# Altium schematic symbol library Regulator_Switching.SchLib: 1120 symbols (part 2 of 8)
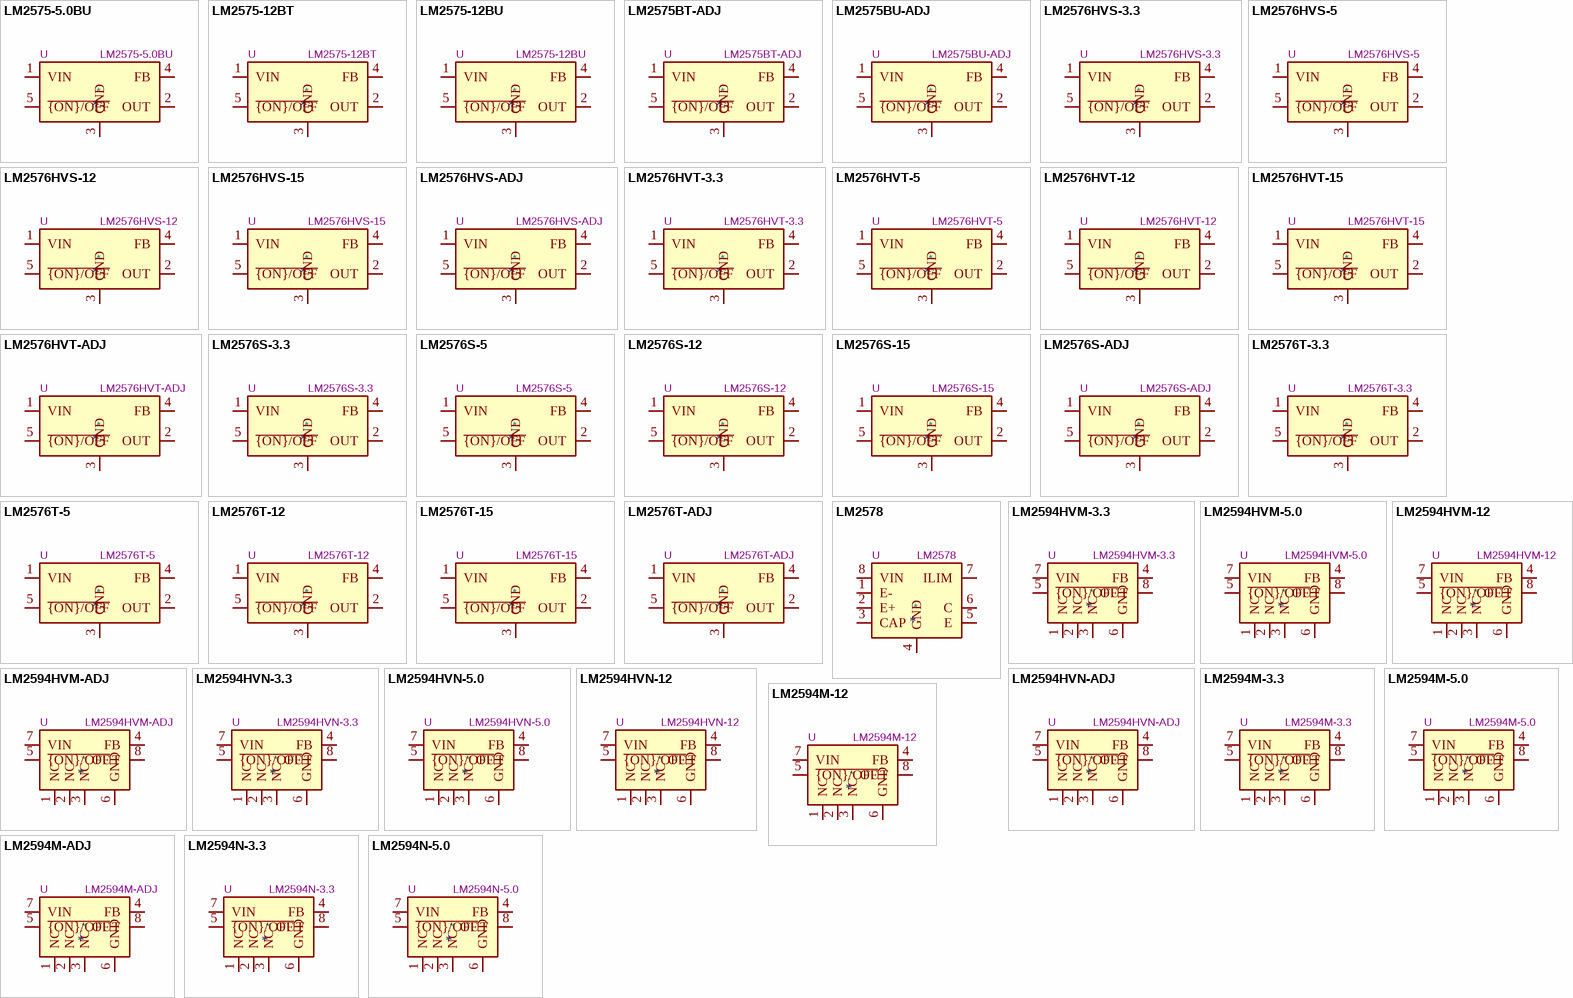
[diagram p28: symbols LM2575-5.0BU to LM2594N-5.0]

## LM2576HVT-12
designator *  value LM2576HVT-12  Reference: U
ki_keywords: Step-Down Voltage Regulator 12V 3A High Voltage; ki_description: 12V, 3A SIMPLE SWITCHER® Step-Down Voltage Regulator, High Voltage Input, TO-220-5; ki_fp_filters: TO?220*; Footprint: Package_TO_SOT_THT:TO-220-5_Vertical; Datasheet: http://www.ti.com/lit/ds/symlink/lm2576.pdf
pins: 1 VIN, 2 OUT, 3 GND, 4 FB, 5 ~{{ON}/OFF}

## LM2576HVT-15
designator *  value LM2576HVT-15  Reference: U
ki_keywords: Step-Down Voltage Regulator 15V 3A High Voltage; ki_description: 15V, 3A SIMPLE SWITCHER® Step-Down Voltage Regulator, High Voltage Input, TO-220-5; ki_fp_filters: TO?220*; Footprint: Package_TO_SOT_THT:TO-220-5_Vertical; Datasheet: http://www.ti.com/lit/ds/symlink/lm2576.pdf
pins: 1 VIN, 2 OUT, 3 GND, 4 FB, 5 ~{{ON}/OFF}

## LM2576HVT-ADJ
designator *  value LM2576HVT-ADJ  Reference: U
ki_keywords: Step-Down Voltage Regulator 3A Adjustable High Voltage; ki_description: Adjustable Output Voltage, 3A SIMPLE SWITCHER® Step-Down Voltage Regulator, High Voltage Input, TO-220-5; ki_fp_filters: TO?220*; Footprint: Package_TO_SOT_THT:TO-220-5_Vertical; Datasheet: http://www.ti.com/lit/ds/symlink/lm2576.pdf
pins: 1 VIN, 2 OUT, 3 GND, 4 FB, 5 ~{{ON}/OFF}

## LM2576S-3.3
designator *  value LM2576S-3.3  Reference: U
ki_keywords: Step-Down Voltage Regulator 3.3V 3A; ki_description: 3.3V, 3A SIMPLE SWITCHER® Step-Down Voltage Regulator, TO-263; ki_fp_filters: TO?263*; Footprint: Package_TO_SOT_SMD:TO-263-5_TabPin3; Datasheet: http://www.ti.com/lit/ds/symlink/lm2576.pdf
pins: 1 VIN, 2 OUT, 3 GND, 4 FB, 5 ~{{ON}/OFF}

## LM2576S-5
designator *  value LM2576S-5  Reference: U
ki_keywords: Step-Down Voltage Regulator 5V 3A; ki_description: 5V, 3A SIMPLE SWITCHER® Step-Down Voltage Regulator, TO-263; ki_fp_filters: TO?263*; Footprint: Package_TO_SOT_SMD:TO-263-5_TabPin3; Datasheet: http://www.ti.com/lit/ds/symlink/lm2576.pdf
pins: 1 VIN, 2 OUT, 3 GND, 4 FB, 5 ~{{ON}/OFF}

## LM2576S-12
designator *  value LM2576S-12  Reference: U
ki_keywords: Step-Down Voltage Regulator 12V 3A; ki_description: 12V, 3A SIMPLE SWITCHER® Step-Down Voltage Regulator, TO-263; ki_fp_filters: TO?263*; Footprint: Package_TO_SOT_SMD:TO-263-5_TabPin3; Datasheet: http://www.ti.com/lit/ds/symlink/lm2576.pdf
pins: 1 VIN, 2 OUT, 3 GND, 4 FB, 5 ~{{ON}/OFF}

## LM2576S-15
designator *  value LM2576S-15  Reference: U
ki_keywords: Step-Down Voltage Regulator 15V 3A; ki_description: 15V, 3A SIMPLE SWITCHER® Step-Down Voltage Regulator, TO-263; ki_fp_filters: TO?263*; Footprint: Package_TO_SOT_SMD:TO-263-5_TabPin3; Datasheet: http://www.ti.com/lit/ds/symlink/lm2576.pdf
pins: 1 VIN, 2 OUT, 3 GND, 4 FB, 5 ~{{ON}/OFF}

## LM2576S-ADJ
designator *  value LM2576S-ADJ  Reference: U
ki_keywords: Step-Down Voltage Regulator 3A Adjustable; ki_description: Adjustable Output Voltage, 3A SIMPLE SWITCHER® Step-Down Voltage Regulator, TO-263; ki_fp_filters: TO?263*; Footprint: Package_TO_SOT_SMD:TO-263-5_TabPin3; Datasheet: http://www.ti.com/lit/ds/symlink/lm2576.pdf
pins: 1 VIN, 2 OUT, 3 GND, 4 FB, 5 ~{{ON}/OFF}

## LM2576T-3.3
designator *  value LM2576T-3.3  Reference: U
ki_keywords: Step-Down Voltage Regulator 3.3V 3A; ki_description: 3.3V, 3A SIMPLE SWITCHER® Step-Down Voltage Regulator, TO-220-5; ki_fp_filters: TO?220*; Footprint: Package_TO_SOT_THT:TO-220-5_Vertical; Datasheet: http://www.ti.com/lit/ds/symlink/lm2576.pdf
pins: 1 VIN, 2 OUT, 3 GND, 4 FB, 5 ~{{ON}/OFF}

## LM2576T-5
designator *  value LM2576T-5  Reference: U
ki_keywords: Step-Down Voltage Regulator 5V 3A; ki_description: 5V, 3A SIMPLE SWITCHER® Step-Down Voltage Regulator, TO-220-5; ki_fp_filters: TO?220*; Footprint: Package_TO_SOT_THT:TO-220-5_Vertical; Datasheet: http://www.ti.com/lit/ds/symlink/lm2576.pdf
pins: 1 VIN, 2 OUT, 3 GND, 4 FB, 5 ~{{ON}/OFF}

## LM2576T-12
designator *  value LM2576T-12  Reference: U
ki_keywords: Step-Down Voltage Regulator 12V 3A; ki_description: 12V, 3A SIMPLE SWITCHER® Step-Down Voltage Regulator, TO-220-5; ki_fp_filters: TO?220*; Footprint: Package_TO_SOT_THT:TO-220-5_Vertical; Datasheet: http://www.ti.com/lit/ds/symlink/lm2576.pdf
pins: 1 VIN, 2 OUT, 3 GND, 4 FB, 5 ~{{ON}/OFF}

## LM2576T-15
designator *  value LM2576T-15  Reference: U
ki_keywords: Step-Down Voltage Regulator 15V 3A; ki_description: 15V, 3A SIMPLE SWITCHER® Step-Down Voltage Regulator, TO-220-5; ki_fp_filters: TO?220*; Footprint: Package_TO_SOT_THT:TO-220-5_Vertical; Datasheet: http://www.ti.com/lit/ds/symlink/lm2576.pdf
pins: 1 VIN, 2 OUT, 3 GND, 4 FB, 5 ~{{ON}/OFF}

## LM2576T-ADJ
designator *  value LM2576T-ADJ  Reference: U
ki_keywords: Step-Down Voltage Regulator 3A Adjustable; ki_description: Adjustable Output Voltage, 3A SIMPLE SWITCHER® Step-Down Voltage Regulator, TO-220-5; ki_fp_filters: TO?220*; Footprint: Package_TO_SOT_THT:TO-220-5_Vertical; Datasheet: http://www.ti.com/lit/ds/symlink/lm2576.pdf
pins: 1 VIN, 2 OUT, 3 GND, 4 FB, 5 ~{{ON}/OFF}

## LM2578
designator *  value LM2578  Reference: U
ki_keywords: switching regulator; ki_description: 750mA, Switching Regulator, adjustable output voltage, DIP-8/SOIC-8; ki_fp_filters: DIP*W7.62mm* SOIC*3.9x4.9mm*; Datasheet: http://www.ti.com/lit/ds/symlink/lm3578a.pdf
pins: 1 E-, 2 E+, 3 CAP, 4 GND, 5 E, 6 C, 7 ILIM, 8 VIN

## LM2594HVM-3.3
designator *  value LM2594HVM-3.3  Reference: U
ki_keywords: buck converter regulator step-down voltage simple switcher fixed; ki_description: 3.3V, 0.5A SIMPLE SWITCHER® Step-Down Voltage Regulator, Maximum VIN 60V, SOIC-8; ki_fp_filters: SOIC*3.9x4.9mm*; Footprint: Package_SO:SOIC-8_3.9x4.9mm_P1.27mm; Datasheet: http://www.ti.com/lit/ds/symlink/lm2594.pdf
pins: 1 NC, 2 NC, 3 NC, 4 FB, 5 ~{{ON}/OFF}, 6 GND, 7 VIN, 8 OUT

## LM2594HVM-5.0
designator *  value LM2594HVM-5.0  Reference: U
ki_keywords: buck converter regulator step-down voltage simple switcher fixed; ki_description: 5.0V, 0.5A SIMPLE SWITCHER® Step-Down Voltage Regulator, Maximum VIN 60V, SOIC-8; ki_fp_filters: SOIC*3.9x4.9mm*; Footprint: Package_SO:SOIC-8_3.9x4.9mm_P1.27mm; Datasheet: http://www.ti.com/lit/ds/symlink/lm2594.pdf
pins: 1 NC, 2 NC, 3 NC, 4 FB, 5 ~{{ON}/OFF}, 6 GND, 7 VIN, 8 OUT

## LM2594HVM-12
designator *  value LM2594HVM-12  Reference: U
ki_keywords: buck converter regulator step-down voltage simple switcher fixed; ki_description: 12V, 0.5A SIMPLE SWITCHER® Step-Down Voltage Regulator, Maximum VIN 60V, SOIC-8; ki_fp_filters: SOIC*3.9x4.9mm*; Footprint: Package_SO:SOIC-8_3.9x4.9mm_P1.27mm; Datasheet: http://www.ti.com/lit/ds/symlink/lm2594.pdf
pins: 1 NC, 2 NC, 3 NC, 4 FB, 5 ~{{ON}/OFF}, 6 GND, 7 VIN, 8 OUT

## LM2594HVM-ADJ
designator *  value LM2594HVM-ADJ  Reference: U
ki_keywords: buck converter regulator step-down voltage simple switcher adjustable; ki_description: Adjustable Output Voltage, 0.5A SIMPLE SWITCHER® Step-Down Voltage Regulator, Maximum VIN 60V, SOIC-8; ki_fp_filters: SOIC*3.9x4.9mm*; Footprint: Package_SO:SOIC-8_3.9x4.9mm_P1.27mm; Datasheet: http://www.ti.com/lit/ds/symlink/lm2594.pdf
pins: 1 NC, 2 NC, 3 NC, 4 FB, 5 ~{{ON}/OFF}, 6 GND, 7 VIN, 8 OUT

## LM2594HVN-3.3
designator *  value LM2594HVN-3.3  Reference: U
ki_keywords: buck converter regulator step-down voltage simple switcher fixed; ki_description: 3.3V, 0.5A SIMPLE SWITCHER® Step-Down Voltage Regulator, Maximum VIN 60V, DIP-8; ki_fp_filters: DIP*W7.62mm*; Footprint: Package_DIP:DIP-8_W7.62mm; Datasheet: http://www.ti.com/lit/ds/symlink/lm2594.pdf
pins: 1 NC, 2 NC, 3 NC, 4 FB, 5 ~{{ON}/OFF}, 6 GND, 7 VIN, 8 OUT

## LM2594HVN-5.0
designator *  value LM2594HVN-5.0  Reference: U
ki_keywords: buck converter regulator step-down voltage simple switcher fixed; ki_description: 5.0V, 0.5A SIMPLE SWITCHER® Step-Down Voltage Regulator, Maximum VIN 60V, DIP-8; ki_fp_filters: DIP*W7.62mm*; Footprint: Package_DIP:DIP-8_W7.62mm; Datasheet: http://www.ti.com/lit/ds/symlink/lm2594.pdf
pins: 1 NC, 2 NC, 3 NC, 4 FB, 5 ~{{ON}/OFF}, 6 GND, 7 VIN, 8 OUT

## LM2594HVN-12
designator *  value LM2594HVN-12  Reference: U
ki_keywords: buck converter regulator step-down voltage simple switcher fixed; ki_description: 12V, 0.5A SIMPLE SWITCHER® Step-Down Voltage Regulator, Maximum VIN 60V, DIP-8; ki_fp_filters: DIP*W7.62mm*; Footprint: Package_DIP:DIP-8_W7.62mm; Datasheet: http://www.ti.com/lit/ds/symlink/lm2594.pdf
pins: 1 NC, 2 NC, 3 NC, 4 FB, 5 ~{{ON}/OFF}, 6 GND, 7 VIN, 8 OUT

## LM2594HVN-ADJ
designator *  value LM2594HVN-ADJ  Reference: U
ki_keywords: buck converter regulator step-down voltage simple switcher adjustable; ki_description: Adjustable Output Voltage, 0.5A SIMPLE SWITCHER® Step-Down Voltage Regulator, Maximum VIN 60V, DIP-8; ki_fp_filters: DIP*W7.62mm*; Footprint: Package_DIP:DIP-8_W7.62mm; Datasheet: http://www.ti.com/lit/ds/symlink/lm2594.pdf
pins: 1 NC, 2 NC, 3 NC, 4 FB, 5 ~{{ON}/OFF}, 6 GND, 7 VIN, 8 OUT

## LM2594M-3.3
designator *  value LM2594M-3.3  Reference: U
ki_keywords: buck converter regulator step-down voltage simple switcher fixed; ki_description: 3.3V, 0.5A SIMPLE SWITCHER® Step-Down Voltage Regulator, Maximum VIN 45V, SOIC-8; ki_fp_filters: SOIC*3.9x4.9mm*; Footprint: Package_SO:SOIC-8_3.9x4.9mm_P1.27mm; Datasheet: http://www.ti.com/lit/ds/symlink/lm2594.pdf
pins: 1 NC, 2 NC, 3 NC, 4 FB, 5 ~{{ON}/OFF}, 6 GND, 7 VIN, 8 OUT

## LM2594M-5.0
designator *  value LM2594M-5.0  Reference: U
ki_keywords: buck converter regulator step-down voltage simple switcher fixed; ki_description: 5.0V, 0.5A SIMPLE SWITCHER® Step-Down Voltage Regulator, Maximum VIN 45V, SOIC-8; ki_fp_filters: SOIC*3.9x4.9mm*; Footprint: Package_SO:SOIC-8_3.9x4.9mm_P1.27mm; Datasheet: http://www.ti.com/lit/ds/symlink/lm2594.pdf
pins: 1 NC, 2 NC, 3 NC, 4 FB, 5 ~{{ON}/OFF}, 6 GND, 7 VIN, 8 OUT

## LM2594M-12
designator *  value LM2594M-12  Reference: U
ki_keywords: buck converter regulator step-down voltage simple switcher fixed; ki_description: 12V, 0.5A SIMPLE SWITCHER® Step-Down Voltage Regulator, Maximum VIN 45V, SOIC-8; ki_fp_filters: SOIC*3.9x4.9mm*; Footprint: Package_SO:SOIC-8_3.9x4.9mm_P1.27mm; Datasheet: http://www.ti.com/lit/ds/symlink/lm2594.pdf
pins: 1 NC, 2 NC, 3 NC, 4 FB, 5 ~{{ON}/OFF}, 6 GND, 7 VIN, 8 OUT

## LM2594M-ADJ
designator *  value LM2594M-ADJ  Reference: U
ki_keywords: buck converter regulator step-down voltage simple switcher adjustable; ki_description: Adjustable Output Voltage, 0.5A SIMPLE SWITCHER® Step-Down Voltage Regulator, Maximum VIN 45V, SOIC-8; ki_fp_filters: SOIC*3.9x4.9mm*; Footprint: Package_SO:SOIC-8_3.9x4.9mm_P1.27mm; Datasheet: http://www.ti.com/lit/ds/symlink/lm2594.pdf
pins: 1 NC, 2 NC, 3 NC, 4 FB, 5 ~{{ON}/OFF}, 6 GND, 7 VIN, 8 OUT

## LM2594N-3.3
designator *  value LM2594N-3.3  Reference: U
ki_keywords: buck converter regulator step-down voltage simple switcher fixed; ki_description: 3.3V, 0.5A SIMPLE SWITCHER® Step-Down Voltage Regulator, Maximum VIN 45V, DIP-8; ki_fp_filters: DIP*W7.62mm*; Footprint: Package_DIP:DIP-8_W7.62mm; Datasheet: http://www.ti.com/lit/ds/symlink/lm2594.pdf
pins: 1 NC, 2 NC, 3 NC, 4 FB, 5 ~{{ON}/OFF}, 6 GND, 7 VIN, 8 OUT

## LM2594N-5.0
designator *  value LM2594N-5.0  Reference: U
ki_keywords: buck converter regulator step-down voltage simple switcher fixed; ki_description: 5.0V, 0.5A SIMPLE SWITCHER® Step-Down Voltage Regulator, Maximum VIN 45V, DIP-8; ki_fp_filters: DIP*W7.62mm*; Footprint: Package_DIP:DIP-8_W7.62mm; Datasheet: http://www.ti.com/lit/ds/symlink/lm2594.pdf
pins: 1 NC, 2 NC, 3 NC, 4 FB, 5 ~{{ON}/OFF}, 6 GND, 7 VIN, 8 OUT

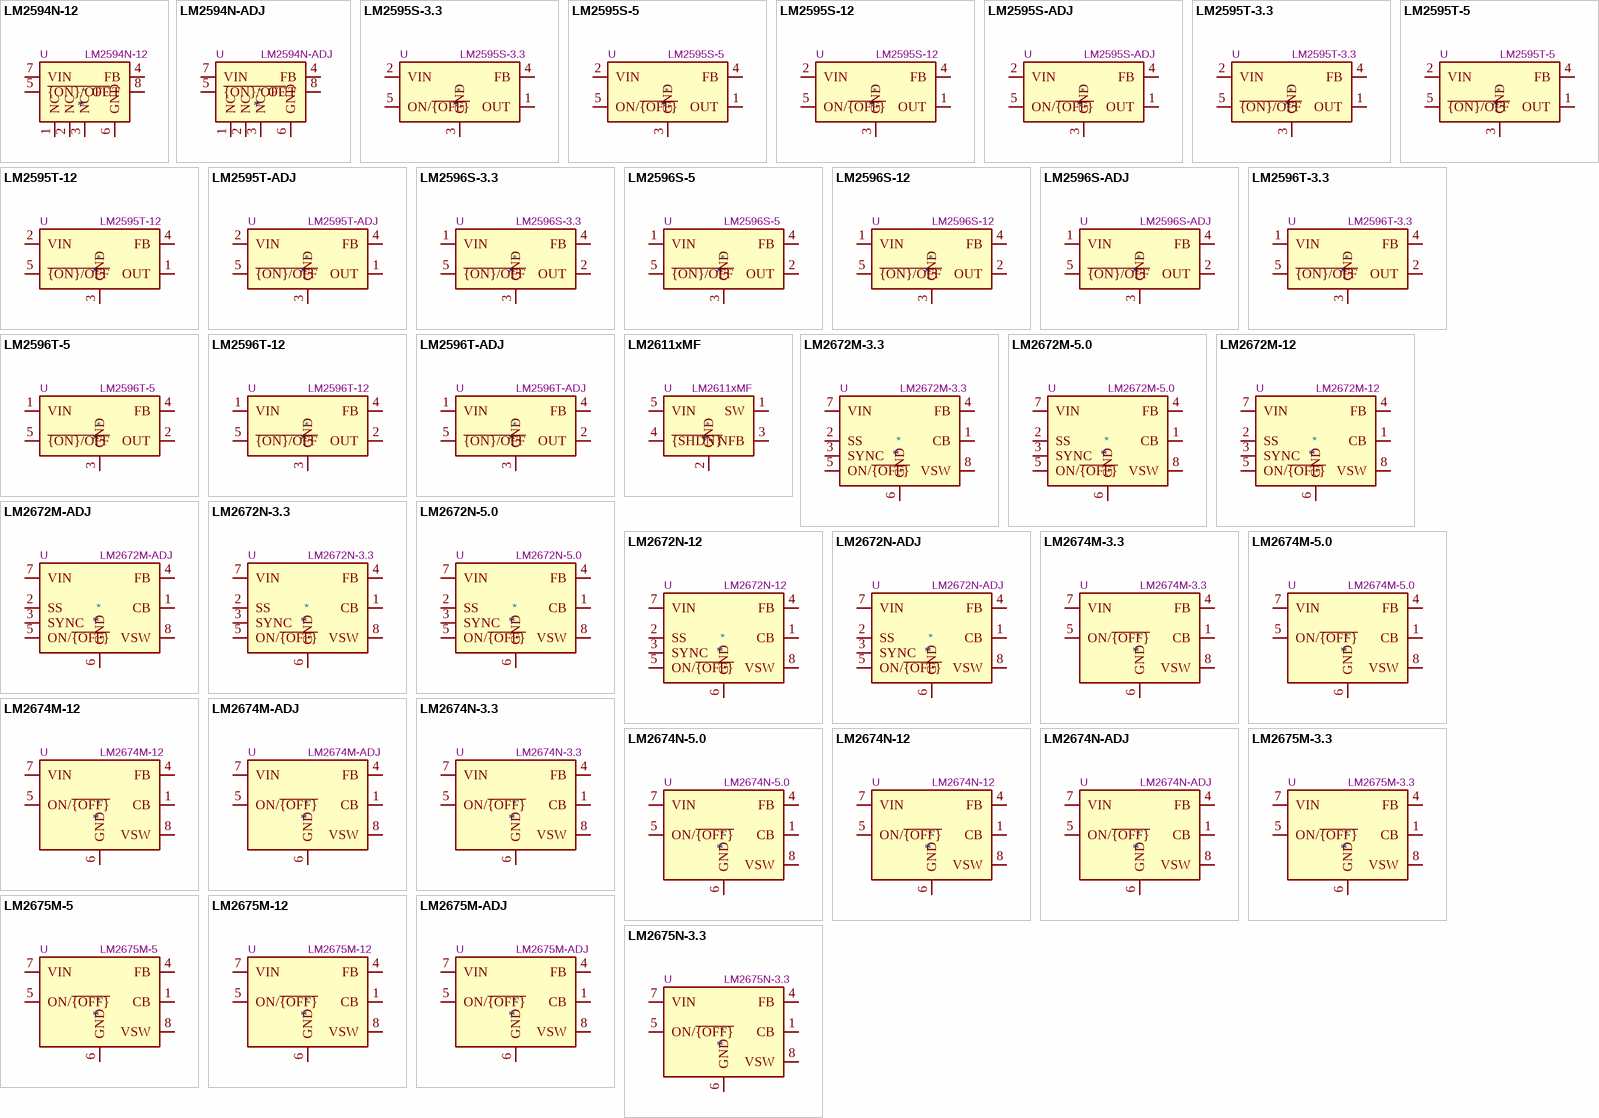
[diagram p5: symbols LM2594N-12 to LM2675N-3.3]

## LM2594N-12
designator *  value LM2594N-12  Reference: U
ki_keywords: buck converter regulator step-down voltage simple switcher fixed; ki_description: 12V, 0.5A SIMPLE SWITCHER® Step-Down Voltage Regulator, Maximum VIN 45V, DIP-8; ki_fp_filters: DIP*W7.62mm*; Footprint: Package_DIP:DIP-8_W7.62mm; Datasheet: http://www.ti.com/lit/ds/symlink/lm2594.pdf
pins: 1 NC, 2 NC, 3 NC, 4 FB, 5 ~{{ON}/OFF}, 6 GND, 7 VIN, 8 OUT

## LM2594N-ADJ
designator *  value LM2594N-ADJ  Reference: U
ki_keywords: buck converter regulator step-down voltage simple switcher adjustable; ki_description: Adjustable Output Voltage, 0.5A SIMPLE SWITCHER® Step-Down Voltage Regulator, Maximum VIN 45V, DIP-8; ki_fp_filters: DIP*W7.62mm*; Footprint: Package_DIP:DIP-8_W7.62mm; Datasheet: http://www.ti.com/lit/ds/symlink/lm2594.pdf
pins: 1 NC, 2 NC, 3 NC, 4 FB, 5 ~{{ON}/OFF}, 6 GND, 7 VIN, 8 OUT

## LM2595S-3.3
designator *  value LM2595S-3.3  Reference: U
ki_keywords: Step-Down Voltage Regulator 3.3V 1A; ki_description: 3.3V, 1A Step-Down Voltage Regulator, TO-263-5; ki_fp_filters: TO?263*; Footprint: Package_TO_SOT_SMD:TO-263-5_TabPin3; Datasheet: http://www.ti.com.cn/cn/lit/ds/symlink/lm2595.pdf
pins: 1 OUT, 2 VIN, 3 GND, 4 FB, 5 ON/~{{OFF}}

## LM2595S-5
designator *  value LM2595S-5  Reference: U
ki_keywords: Step-Down Voltage Regulator 5V 1A; ki_description: 5V, 1A Step-Down Voltage Regulator, TO-263-5; ki_fp_filters: TO?263*; Footprint: Package_TO_SOT_SMD:TO-263-5_TabPin3; Datasheet: http://www.ti.com.cn/cn/lit/ds/symlink/lm2595.pdf
pins: 1 OUT, 2 VIN, 3 GND, 4 FB, 5 ON/~{{OFF}}

## LM2595S-12
designator *  value LM2595S-12  Reference: U
ki_keywords: Step-Down Voltage Regulator 12V 1A; ki_description: 12V, 1A Step-Down Voltage Regulator, TO-263-5; ki_fp_filters: TO?263*; Footprint: Package_TO_SOT_SMD:TO-263-5_TabPin3; Datasheet: http://www.ti.com.cn/cn/lit/ds/symlink/lm2595.pdf
pins: 1 OUT, 2 VIN, 3 GND, 4 FB, 5 ON/~{{OFF}}

## LM2595S-ADJ
designator *  value LM2595S-ADJ  Reference: U
ki_keywords: Step-Down Voltage Regulator 1A Adjustable; ki_description: Adjustable Output 1A Step-Down Voltage Regulator, TO-263-5; ki_fp_filters: TO?263*; Footprint: Package_TO_SOT_SMD:TO-263-5_TabPin3; Datasheet: http://www.ti.com.cn/cn/lit/ds/symlink/lm2595.pdf
pins: 1 OUT, 2 VIN, 3 GND, 4 FB, 5 ON/~{{OFF}}

## LM2595T-3.3
designator *  value LM2595T-3.3  Reference: U
ki_keywords: Step-Down Voltage Regulator 3.3V 1A; ki_description: 3.3V, 1A Step-Down Voltage Regulator, TO-220-5; ki_fp_filters: TO?220*; Footprint: Package_TO_SOT_THT:TO-220-5_P3.4x3.7mm_StaggerOdd_Lead3.8mm_Vertical; Datasheet: http://www.ti.com.cn/cn/lit/ds/symlink/lm2595.pdf
pins: 1 OUT, 2 VIN, 3 GND, 4 FB, 5 ~{{ON}/OFF}

## LM2595T-5
designator *  value LM2595T-5  Reference: U
ki_keywords: Step-Down Voltage Regulator 5V 1A; ki_description: 5V, 1A Step-Down Voltage Regulator, TO-220-5; ki_fp_filters: TO?220*; Footprint: Package_TO_SOT_THT:TO-220-5_P3.4x3.7mm_StaggerOdd_Lead3.8mm_Vertical; Datasheet: http://www.ti.com.cn/cn/lit/ds/symlink/lm2595.pdf
pins: 1 OUT, 2 VIN, 3 GND, 4 FB, 5 ~{{ON}/OFF}

## LM2595T-12
designator *  value LM2595T-12  Reference: U
ki_keywords: Step-Down Voltage Regulator 12V 1A; ki_description: 12V, 1A Step-Down Voltage Regulator, TO-220-5; ki_fp_filters: TO?220*; Footprint: Package_TO_SOT_THT:TO-220-5_P3.4x3.7mm_StaggerOdd_Lead3.8mm_Vertical; Datasheet: http://www.ti.com.cn/cn/lit/ds/symlink/lm2595.pdf
pins: 1 OUT, 2 VIN, 3 GND, 4 FB, 5 ~{{ON}/OFF}

## LM2595T-ADJ
designator *  value LM2595T-ADJ  Reference: U
ki_keywords: Step-Down Voltage Regulator 1A Adjustable; ki_description: Adjustable Output 1A Step-Down Voltage Regulator, TO-220-5; ki_fp_filters: TO?220*; Footprint: Package_TO_SOT_THT:TO-220-5_P3.4x3.7mm_StaggerOdd_Lead3.8mm_Vertical; Datasheet: http://www.ti.com.cn/cn/lit/ds/symlink/lm2595.pdf
pins: 1 OUT, 2 VIN, 3 GND, 4 FB, 5 ~{{ON}/OFF}

## LM2596S-3.3
designator *  value LM2596S-3.3  Reference: U
ki_keywords: Step-Down Voltage Regulator 3.3V 3A; ki_description: 3.3V 3A Step-Down Voltage Regulator, TO-263; ki_fp_filters: TO?263*; Footprint: Package_TO_SOT_SMD:TO-263-5_TabPin3; Datasheet: http://www.ti.com/lit/ds/symlink/lm2596.pdf
pins: 1 VIN, 2 OUT, 3 GND, 4 FB, 5 ~{{ON}/OFF}

## LM2596S-5
designator *  value LM2596S-5  Reference: U
ki_keywords: Step-Down Voltage Regulator 5V 3A; ki_description: 5V 3A Step-Down Voltage Regulator, TO-263; ki_fp_filters: TO?263*; Footprint: Package_TO_SOT_SMD:TO-263-5_TabPin3; Datasheet: http://www.ti.com/lit/ds/symlink/lm2596.pdf
pins: 1 VIN, 2 OUT, 3 GND, 4 FB, 5 ~{{ON}/OFF}

## LM2596S-12
designator *  value LM2596S-12  Reference: U
ki_keywords: Step-Down Voltage Regulator 12V 3A; ki_description: 12V 3A Step-Down Voltage Regulator, TO-263; ki_fp_filters: TO?263*; Footprint: Package_TO_SOT_SMD:TO-263-5_TabPin3; Datasheet: http://www.ti.com/lit/ds/symlink/lm2596.pdf
pins: 1 VIN, 2 OUT, 3 GND, 4 FB, 5 ~{{ON}/OFF}

## LM2596S-ADJ
designator *  value LM2596S-ADJ  Reference: U
ki_keywords: Step-Down Voltage Regulator Adjustable 3A; ki_description: Adjustable 3A Step-Down Voltage Regulator, TO-263; ki_fp_filters: TO?263*; Footprint: Package_TO_SOT_SMD:TO-263-5_TabPin3; Datasheet: http://www.ti.com/lit/ds/symlink/lm2596.pdf
pins: 1 VIN, 2 OUT, 3 GND, 4 FB, 5 ~{{ON}/OFF}

## LM2596T-3.3
designator *  value LM2596T-3.3  Reference: U
ki_keywords: Step-Down Voltage Regulator 3.3V 3A; ki_description: 3.3V 3A 150kHz Step-Down Voltage Regulator, TO-220; ki_fp_filters: TO?220*; Footprint: Package_TO_SOT_THT:TO-220-5_P3.4x3.7mm_StaggerOdd_Lead3.8mm_Vertical; Datasheet: http://www.ti.com/lit/ds/symlink/lm2596.pdf
pins: 1 VIN, 2 OUT, 3 GND, 4 FB, 5 ~{{ON}/OFF}

## LM2596T-5
designator *  value LM2596T-5  Reference: U
ki_keywords: Step-Down Voltage Regulator 5V 3A; ki_description: 5V 3A 150kHz Step-Down Voltage Regulator, TO-220; ki_fp_filters: TO?220*; Footprint: Package_TO_SOT_THT:TO-220-5_P3.4x3.7mm_StaggerOdd_Lead3.8mm_Vertical; Datasheet: http://www.ti.com/lit/ds/symlink/lm2596.pdf
pins: 1 VIN, 2 OUT, 3 GND, 4 FB, 5 ~{{ON}/OFF}

## LM2596T-12
designator *  value LM2596T-12  Reference: U
ki_keywords: Step-Down Voltage Regulator 12V 3A; ki_description: 12V 3A 150kHz Step-Down Voltage Regulator, TO-220; ki_fp_filters: TO?220*; Footprint: Package_TO_SOT_THT:TO-220-5_P3.4x3.7mm_StaggerOdd_Lead3.8mm_Vertical; Datasheet: http://www.ti.com/lit/ds/symlink/lm2596.pdf
pins: 1 VIN, 2 OUT, 3 GND, 4 FB, 5 ~{{ON}/OFF}

## LM2596T-ADJ
designator *  value LM2596T-ADJ  Reference: U
ki_keywords: Step-Down Voltage Regulator Adjustable 3A; ki_description: Adjustable 3A 150kHz Step-Down Voltage Regulator, TO-220; ki_fp_filters: TO?220*; Footprint: Package_TO_SOT_THT:TO-220-5_P3.4x3.7mm_StaggerOdd_Lead3.8mm_Vertical; Datasheet: http://www.ti.com/lit/ds/symlink/lm2596.pdf
pins: 1 VIN, 2 OUT, 3 GND, 4 FB, 5 ~{{ON}/OFF}

## LM2611xMF
designator *  value LM2611xMF  Reference: U
ki_keywords: switched converter inverter PWM; ki_description: 1.4MHz Cuk Converter, SOT-23-5; ki_fp_filters: SOT?23*; Footprint: Package_TO_SOT_SMD:SOT-23-5; Datasheet: https://www.ti.com/lit/ds/symlink/lm2611.pdf
pins: 1 SW, 2 GND, 3 NFB, 4 ~{{SHDN}}, 5 VIN

## LM2672M-3.3
designator *  value LM2672M-3.3  Reference: U
ki_keywords: Step-Down Voltage Regulator 3.3V 1A; ki_description: 3.3V, 1A Step-Down Voltage Regulator, SO-8; ki_fp_filters: SOIC*3.9x4.9mm*P1.27mm*; Footprint: Package_SO:SOIC-8_3.9x4.9mm_P1.27mm; Datasheet: http://www.ti.com/lit/ds/symlink/lm2672.pdf
pins: 1 CB, 2 SS, 3 SYNC, 4 FB, 5 ON/~{{OFF}}, 6 GND, 7 VIN, 8 VSW

## LM2672M-5.0
designator *  value LM2672M-5.0  Reference: U
ki_keywords: Step-Down Voltage Regulator 5V 1A; ki_description: 5V, 1A Step-Down Voltage Regulator, SO-8; ki_fp_filters: SOIC*3.9x4.9mm*P1.27mm*; Footprint: Package_SO:SOIC-8_3.9x4.9mm_P1.27mm; Datasheet: http://www.ti.com/lit/ds/symlink/lm2672.pdf
pins: 1 CB, 2 SS, 3 SYNC, 4 FB, 5 ON/~{{OFF}}, 6 GND, 7 VIN, 8 VSW

## LM2672M-12
designator *  value LM2672M-12  Reference: U
ki_keywords: Step-Down Voltage Regulator 12V 1A; ki_description: 12V, 1A Step-Down Voltage Regulator, SO-8; ki_fp_filters: SOIC*3.9x4.9mm*P1.27mm*; Footprint: Package_SO:SOIC-8_3.9x4.9mm_P1.27mm; Datasheet: http://www.ti.com/lit/ds/symlink/lm2672.pdf
pins: 1 CB, 2 SS, 3 SYNC, 4 FB, 5 ON/~{{OFF}}, 6 GND, 7 VIN, 8 VSW

## LM2672M-ADJ
designator *  value LM2672M-ADJ  Reference: U
ki_keywords: Step-Down Voltage Regulator; ki_description: Adjustable Output Voltage, 1A Step-Down Voltage Regulator, SO-8; ki_fp_filters: SOIC*3.9x4.9mm*P1.27mm*; Footprint: Package_SO:SOIC-8_3.9x4.9mm_P1.27mm; Datasheet: http://www.ti.com/lit/ds/symlink/lm2672.pdf
pins: 1 CB, 2 SS, 3 SYNC, 4 FB, 5 ON/~{{OFF}}, 6 GND, 7 VIN, 8 VSW

## LM2672N-3.3
designator *  value LM2672N-3.3  Reference: U
ki_keywords: Step-Down Voltage Regulator 3.3V 1A; ki_description: 3.3V, 1A Step-Down Voltage Regulator, DIP-8; ki_fp_filters: DIP*W7.62mm*; Footprint: Package_DIP:DIP-8_W7.62mm; Datasheet: http://www.ti.com/lit/ds/symlink/lm2672.pdf
pins: 1 CB, 2 SS, 3 SYNC, 4 FB, 5 ON/~{{OFF}}, 6 GND, 7 VIN, 8 VSW

## LM2672N-5.0
designator *  value LM2672N-5.0  Reference: U
ki_keywords: Step-Down Voltage Regulator 5V 1A; ki_description: 5V, 1A Step-Down Voltage Regulator, DIP-8; ki_fp_filters: DIP*W7.62mm*; Footprint: Package_DIP:DIP-8_W7.62mm; Datasheet: http://www.ti.com/lit/ds/symlink/lm2672.pdf
pins: 1 CB, 2 SS, 3 SYNC, 4 FB, 5 ON/~{{OFF}}, 6 GND, 7 VIN, 8 VSW

## LM2672N-12
designator *  value LM2672N-12  Reference: U
ki_keywords: Step-Down Voltage Regulator 12V 1A; ki_description: 12V, 1A Step-Down Voltage Regulator, DIP-8; ki_fp_filters: DIP*W7.62mm*; Footprint: Package_DIP:DIP-8_W7.62mm; Datasheet: http://www.ti.com/lit/ds/symlink/lm2672.pdf
pins: 1 CB, 2 SS, 3 SYNC, 4 FB, 5 ON/~{{OFF}}, 6 GND, 7 VIN, 8 VSW

## LM2672N-ADJ
designator *  value LM2672N-ADJ  Reference: U
ki_keywords: Step-Down Voltage Regulator; ki_description: Adjustable Output Voltage, 1A Step-Down Voltage Regulator, DIP-8; ki_fp_filters: DIP*W7.62mm*; Footprint: Package_DIP:DIP-8_W7.62mm; Datasheet: http://www.ti.com/lit/ds/symlink/lm2672.pdf
pins: 1 CB, 2 SS, 3 SYNC, 4 FB, 5 ON/~{{OFF}}, 6 GND, 7 VIN, 8 VSW

## LM2674M-3.3
designator *  value LM2674M-3.3  Reference: U
ki_keywords: Step-Down Voltage Regulator; ki_description: 3.3V, 500mA Step-Down Voltage Regulator, SO-8; ki_fp_filters: SOIC*3.9x4.9mm*P1.27mm*; Footprint: Package_SO:SOIC-8_3.9x4.9mm_P1.27mm; Datasheet: http://www.ti.com/lit/ds/symlink/lm2674.pdf
pins: 1 CB, 2 NC hidden, 3 NC hidden, 4 FB, 5 ON/~{{OFF}}, 6 GND, 7 VIN, 8 VSW

## LM2674M-5.0
designator *  value LM2674M-5.0  Reference: U
ki_keywords: Step-Down Voltage Regulator; ki_description: 5V, 500mA Step-Down Voltage Regulator, SO-8; ki_fp_filters: SOIC*3.9x4.9mm*P1.27mm*; Footprint: Package_SO:SOIC-8_3.9x4.9mm_P1.27mm; Datasheet: http://www.ti.com/lit/ds/symlink/lm2674.pdf
pins: 1 CB, 2 NC hidden, 3 NC hidden, 4 FB, 5 ON/~{{OFF}}, 6 GND, 7 VIN, 8 VSW

## LM2674M-12
designator *  value LM2674M-12  Reference: U
ki_keywords: Step-Down Voltage Regulator 12V 500mA; ki_description: 12V, 500mA Step-Down Voltage Regulator, SO-8; ki_fp_filters: SOIC*3.9x4.9mm*P1.27mm*; Footprint: Package_SO:SOIC-8_3.9x4.9mm_P1.27mm; Datasheet: http://www.ti.com/lit/ds/symlink/lm2674.pdf
pins: 1 CB, 2 NC hidden, 3 NC hidden, 4 FB, 5 ON/~{{OFF}}, 6 GND, 7 VIN, 8 VSW

## LM2674M-ADJ
designator *  value LM2674M-ADJ  Reference: U
ki_keywords: Step-Down Voltage Regulator; ki_description: Adjustable Output Voltage, 500mA Step-Down Voltage Regulator, SO-8; ki_fp_filters: SOIC*3.9x4.9mm*P1.27mm*; Footprint: Package_SO:SOIC-8_3.9x4.9mm_P1.27mm; Datasheet: http://www.ti.com/lit/ds/symlink/lm2674.pdf
pins: 1 CB, 2 NC hidden, 3 NC hidden, 4 FB, 5 ON/~{{OFF}}, 6 GND, 7 VIN, 8 VSW

## LM2674N-3.3
designator *  value LM2674N-3.3  Reference: U
ki_keywords: Step-Down Voltage Regulator; ki_description: 3.3V, 500mA Step-Down Voltage Regulator, DIP-8; ki_fp_filters: DIP*W7.62mm*; Footprint: Package_DIP:DIP-8_W7.62mm; Datasheet: http://www.ti.com/lit/ds/symlink/lm2674.pdf
pins: 1 CB, 2 NC hidden, 3 NC hidden, 4 FB, 5 ON/~{{OFF}}, 6 GND, 7 VIN, 8 VSW

## LM2674N-5.0
designator *  value LM2674N-5.0  Reference: U
ki_keywords: Step-Down Voltage Regulator; ki_description: 5V, 500mA Step-Down Voltage Regulator, DIP-8; ki_fp_filters: DIP*W7.62mm*; Footprint: Package_DIP:DIP-8_W7.62mm; Datasheet: http://www.ti.com/lit/ds/symlink/lm2674.pdf
pins: 1 CB, 2 NC hidden, 3 NC hidden, 4 FB, 5 ON/~{{OFF}}, 6 GND, 7 VIN, 8 VSW

## LM2674N-12
designator *  value LM2674N-12  Reference: U
ki_keywords: Step-Down Voltage Regulator 12V 500mA; ki_description: 12V, 500mA Step-Down Voltage Regulator, DIP-8; ki_fp_filters: DIP*W7.62mm*; Footprint: Package_DIP:DIP-8_W7.62mm; Datasheet: http://www.ti.com/lit/ds/symlink/lm2674.pdf
pins: 1 CB, 2 NC hidden, 3 NC hidden, 4 FB, 5 ON/~{{OFF}}, 6 GND, 7 VIN, 8 VSW

## LM2674N-ADJ
designator *  value LM2674N-ADJ  Reference: U
ki_keywords: Step-Down Voltage Regulator; ki_description: Adjustable Output Voltage, 500mA Step-Down Voltage Regulator, DIP-8; ki_fp_filters: DIP*W7.62mm*; Footprint: Package_DIP:DIP-8_W7.62mm; Datasheet: http://www.ti.com/lit/ds/symlink/lm2674.pdf
pins: 1 CB, 2 NC hidden, 3 NC hidden, 4 FB, 5 ON/~{{OFF}}, 6 GND, 7 VIN, 8 VSW

## LM2675M-3.3
designator *  value LM2675M-3.3  Reference: U
ki_keywords: Step-Down Voltage Regulator 3.3V 1A; ki_description: 3.3V, 1A Step-Down Voltage Regulator, SO-8; ki_fp_filters: SOIC*3.9x4.9mm*P1.27mm*; Footprint: Package_SO:SOIC-8_3.9x4.9mm_P1.27mm; Datasheet: http://www.ti.com/lit/ds/symlink/lm2675.pdf
pins: 1 CB, 2 NC hidden, 3 NC hidden, 4 FB, 5 ON/~{{OFF}}, 6 GND, 7 VIN, 8 VSW

## LM2675M-5
designator *  value LM2675M-5  Reference: U
ki_keywords: Step-Down Voltage Regulator 5V 1A; ki_description: 5V, 1A Step-Down Voltage Regulator, SO-8; ki_fp_filters: SOIC*3.9x4.9mm*P1.27mm*; Footprint: Package_SO:SOIC-8_3.9x4.9mm_P1.27mm; Datasheet: http://www.ti.com/lit/ds/symlink/lm2675.pdf
pins: 1 CB, 2 NC hidden, 3 NC hidden, 4 FB, 5 ON/~{{OFF}}, 6 GND, 7 VIN, 8 VSW

## LM2675M-12
designator *  value LM2675M-12  Reference: U
ki_keywords: Step-Down Voltage Regulator 12V 1A; ki_description: 12V, 1A Step-Down Voltage Regulator, SO-8; ki_fp_filters: SOIC*3.9x4.9mm*P1.27mm*; Footprint: Package_SO:SOIC-8_3.9x4.9mm_P1.27mm; Datasheet: http://www.ti.com/lit/ds/symlink/lm2675.pdf
pins: 1 CB, 2 NC hidden, 3 NC hidden, 4 FB, 5 ON/~{{OFF}}, 6 GND, 7 VIN, 8 VSW

## LM2675M-ADJ
designator *  value LM2675M-ADJ  Reference: U
ki_keywords: Step-Down Voltage Regulator Adjustable; ki_description: Adjustable Output Voltage, 1A Step-Down Voltage Regulator, SO-8; ki_fp_filters: SOIC*3.9x4.9mm*P1.27mm*; Footprint: Package_SO:SOIC-8_3.9x4.9mm_P1.27mm; Datasheet: http://www.ti.com/lit/ds/symlink/lm2675.pdf
pins: 1 CB, 2 NC hidden, 3 NC hidden, 4 FB, 5 ON/~{{OFF}}, 6 GND, 7 VIN, 8 VSW

## LM2675N-3.3
designator *  value LM2675N-3.3  Reference: U
ki_keywords: Step-Down Voltage Regulator 3.3V 1A; ki_description: 3.3V, 1A Step-Down Voltage Regulator, DIP-8; ki_fp_filters: DIP*W7.62mm*; Footprint: Package_DIP:DIP-8_W7.62mm; Datasheet: http://www.ti.com/lit/ds/symlink/lm2675.pdf
pins: 1 CB, 2 NC hidden, 3 NC hidden, 4 FB, 5 ON/~{{OFF}}, 6 GND, 7 VIN, 8 VSW

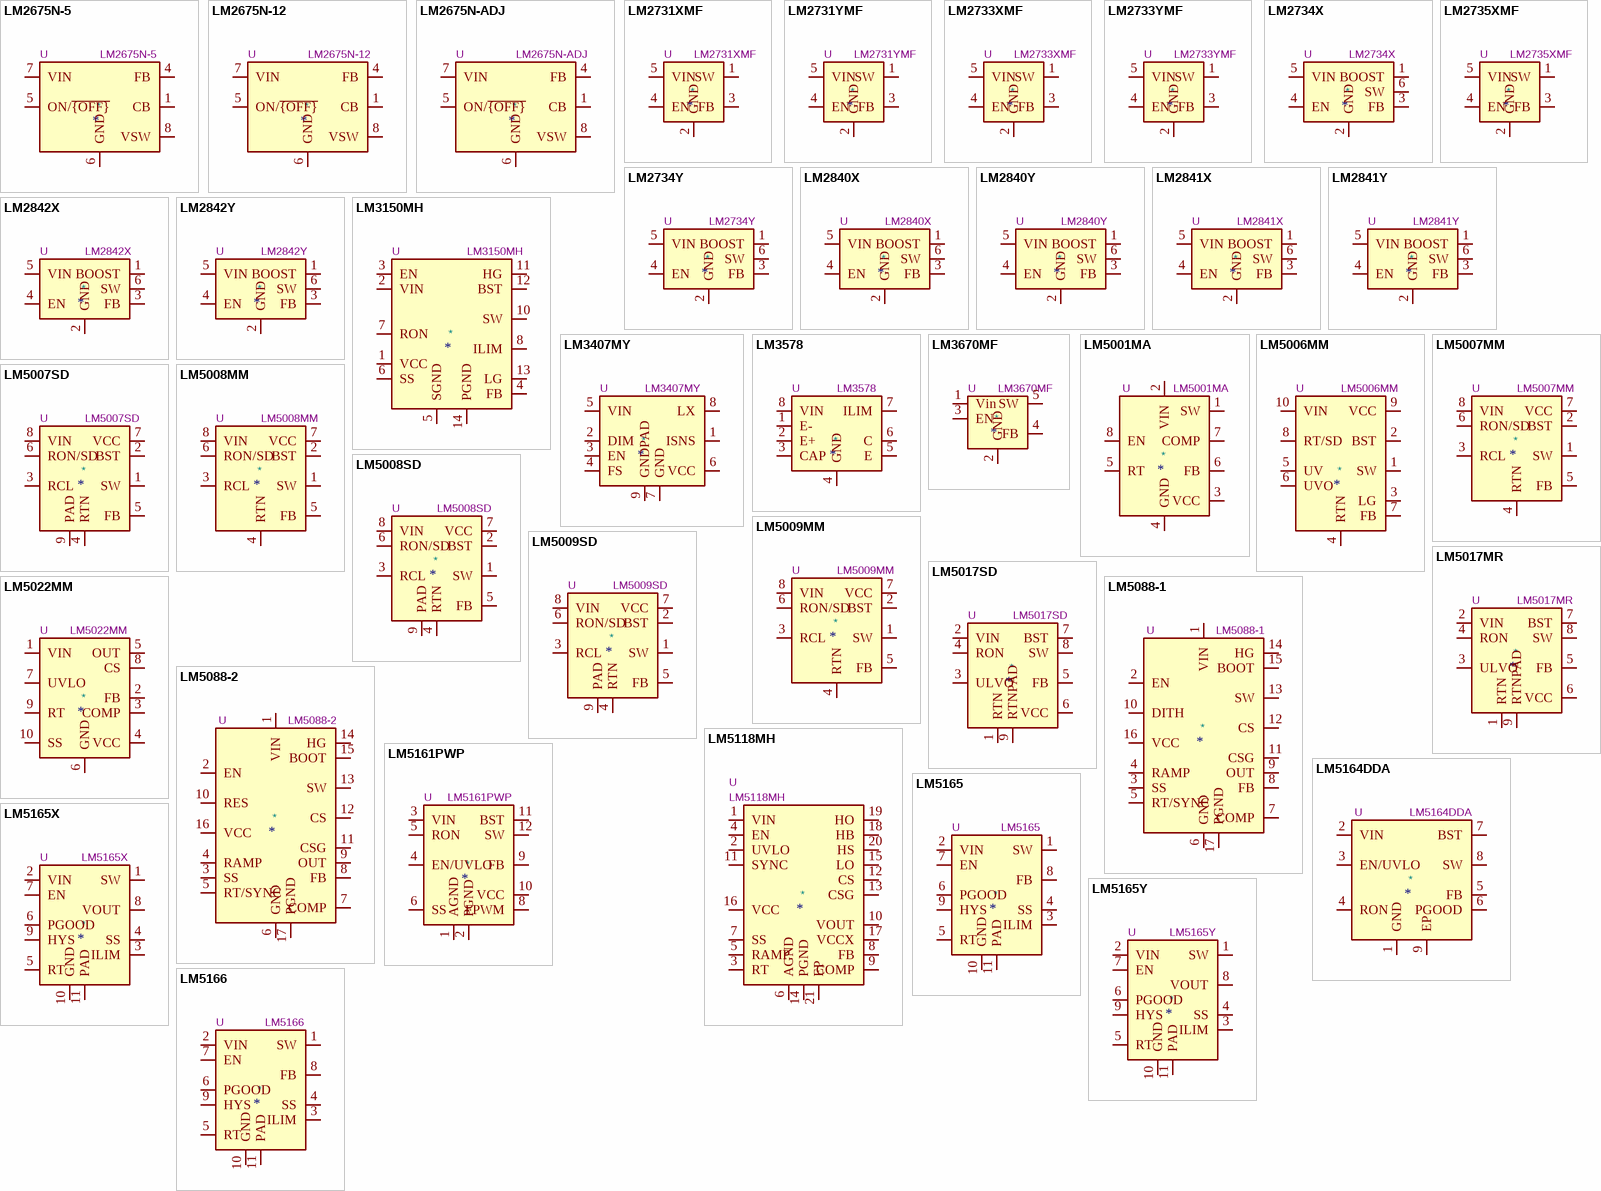
[diagram p6: symbols LM2675N-5 to LM5166]

## LM2675N-5
designator *  value LM2675N-5  Reference: U
ki_keywords: Step-Down Voltage Regulator 5V 1A; ki_description: 5V, 1A Step-Down Voltage Regulator, DIP-8; ki_fp_filters: DIP*W7.62mm*; Footprint: Package_DIP:DIP-8_W7.62mm; Datasheet: http://www.ti.com/lit/ds/symlink/lm2675.pdf
pins: 1 CB, 2 NC hidden, 3 NC hidden, 4 FB, 5 ON/~{{OFF}}, 6 GND, 7 VIN, 8 VSW

## LM2675N-12
designator *  value LM2675N-12  Reference: U
ki_keywords: Step-Down Voltage Regulator 12V 1A; ki_description: 12V, 1A Step-Down Voltage Regulator, DIP-8; ki_fp_filters: DIP*W7.62mm*; Footprint: Package_DIP:DIP-8_W7.62mm; Datasheet: http://www.ti.com/lit/ds/symlink/lm2675.pdf
pins: 1 CB, 2 NC hidden, 3 NC hidden, 4 FB, 5 ON/~{{OFF}}, 6 GND, 7 VIN, 8 VSW

## LM2675N-ADJ
designator *  value LM2675N-ADJ  Reference: U
ki_keywords: Step-Down Voltage Regulator Adjustable; ki_description: Adjustable Output Voltage, 1A Step-Down Voltage Regulator, DIP-8; ki_fp_filters: DIP*W7.62mm*; Footprint: Package_DIP:DIP-8_W7.62mm; Datasheet: http://www.ti.com/lit/ds/symlink/lm2675.pdf
pins: 1 CB, 2 NC hidden, 3 NC hidden, 4 FB, 5 ON/~{{OFF}}, 6 GND, 7 VIN, 8 VSW

## LM2731XMF
designator *  value LM2731XMF  Reference: U
ki_keywords: Miniature Step-Up Boost Voltage Regulator; ki_description: LM27313, 1.8A, 22Vout Boost Voltage Regulator, 1.6MHz Frequency, SOT-23-5; ki_fp_filters: SOT?23*; Footprint: Package_TO_SOT_SMD:SOT-23-5; Datasheet: http://www.ti.com/lit/ds/symlink/lm2731.pdf
pins: 1 SW, 2 GND, 3 FB, 4 EN, 5 VIN

## LM2731YMF
designator *  value LM2731YMF  Reference: U
ki_keywords: Miniature Step-Up Boost Voltage Regulator; ki_description: LM27313, 1.8A, 22Vout Boost Voltage Regulator, 600KHz Frequency,; ki_fp_filters: SOT?23*; Footprint: Package_TO_SOT_SMD:SOT-23-5; Datasheet: http://www.ti.com/lit/ds/symlink/lm2731.pdf
pins: 1 SW, 2 GND, 3 FB, 4 EN, 5 VIN

## LM2733XMF
designator *  value LM2733XMF  Reference: U
ki_keywords: Miniature Step-Up Boost Voltage Regulator; ki_description: LM27313, 1A, 40Vout Boost Voltage Regulator, 1.6MHz Frequency, SOT-23-5; ki_fp_filters: SOT?23*; Footprint: Package_TO_SOT_SMD:SOT-23-5; Datasheet: http://www.ti.com/lit/ds/symlink/lm2733.pdf
pins: 1 SW, 2 GND, 3 FB, 4 EN, 5 VIN

## LM2733YMF
designator *  value LM2733YMF  Reference: U
ki_keywords: Miniature Step-Up Boost Voltage Regulator; ki_description: LM27313, 1A, 40Vout Boost Voltage Regulator, 600KHz Frequency,; ki_fp_filters: SOT?23*; Footprint: Package_TO_SOT_SMD:SOT-23-5; Datasheet: http://www.ti.com/lit/ds/symlink/lm2733.pdf
pins: 1 SW, 2 GND, 3 FB, 4 EN, 5 VIN

## LM2734X
designator *  value LM2734X  Reference: U
ki_keywords: Miniature Step-Down Buck Voltage Regulator; ki_description: 1A Step-Down DC-DC Regulator, Adjustable Output Voltage, 1.6MHz, TSOT-23-5; ki_fp_filters: TSOT?23*; Footprint: Package_TO_SOT_SMD:TSOT-23-6; Datasheet: http://www.ti.com/lit/ds/symlink/lm2734.pdf
pins: 1 BOOST, 2 GND, 3 FB, 4 EN, 5 VIN, 6 SW

## LM2734Y
designator *  value LM2734Y  Reference: U
ki_keywords: Miniature Step-Down Buck Voltage Regulator; ki_description: 1A Step-Down DC-DC Regulator, Adjustable Output Voltage, 550kHz, TSOT-23-5; ki_fp_filters: TSOT?23*; Footprint: Package_TO_SOT_SMD:TSOT-23-6; Datasheet: http://www.ti.com/lit/ds/symlink/lm2734.pdf
pins: 1 BOOST, 2 GND, 3 FB, 4 EN, 5 VIN, 6 SW

## LM2735XMF
designator *  value LM2735XMF  Reference: U
ki_keywords: Miniature Step-Up Boost Flyback SEPIC Voltage Regulator; ki_description: LM27313, 2.1A, 24Vout Boost/FlybacK/SEPIC Voltage Regulator, 520kHz/1.6MHz Frequency,; ki_fp_filters: SOT?23*; Footprint: Package_TO_SOT_SMD:SOT-23-5; Datasheet: http://www.ti.com/lit/ds/symlink/lm2735.pdf
pins: 1 SW, 2 GND, 3 FB, 4 EN, 5 VIN

## LM2840X
designator *  value LM2840X  Reference: U
ki_keywords: Miniature Step-Down Buck Voltage Regulator; ki_description: 100mA 42V Input Step-Down DC-DC Regulator, Adjustable Output Voltage, 550kHz, TSOT-23-5; ki_fp_filters: TSOT?23*; Footprint: Package_TO_SOT_SMD:TSOT-23-6; Datasheet: http://www.ti.com/lit/ds/symlink/lm2842-q1.pdf
pins: 1 BOOST, 2 GND, 3 FB, 4 EN, 5 VIN, 6 SW

## LM2840Y
designator *  value LM2840Y  Reference: U
ki_keywords: Miniature Step-Down Buck Voltage Regulator; ki_description: 100mA 42V Input Step-Down DC-DC Regulator, Adjustable Output Voltage, 1.25MHz, TSOT-23-5; ki_fp_filters: TSOT?23*; Footprint: Package_TO_SOT_SMD:TSOT-23-6; Datasheet: http://www.ti.com/lit/ds/symlink/lm2842-q1.pdf
pins: 1 BOOST, 2 GND, 3 FB, 4 EN, 5 VIN, 6 SW

## LM2841X
designator *  value LM2841X  Reference: U
ki_keywords: Miniature Step-Down Buck Voltage Regulator; ki_description: 300mA 42V Input Step-Down DC-DC Regulator, Adjustable Output Voltage, 550kHz, TSOT-23-5; ki_fp_filters: TSOT?23*; Footprint: Package_TO_SOT_SMD:TSOT-23-6; Datasheet: http://www.ti.com/lit/ds/symlink/lm2842-q1.pdf
pins: 1 BOOST, 2 GND, 3 FB, 4 EN, 5 VIN, 6 SW
